# Altium footprint library TranDangKhoa-LIB.PcbLib: 1435 footprints (part 75 of 90)
Each footprint in its own frame and in the unit in brackets; x right, y up, seen from the top. Pads: shape width x height; smd on the part's side, far side on the other; paste and mask are expansions set on the pad; w line width, h text height; cw(c..) or ccw(c..) is an arc to the next point about the centre after c.
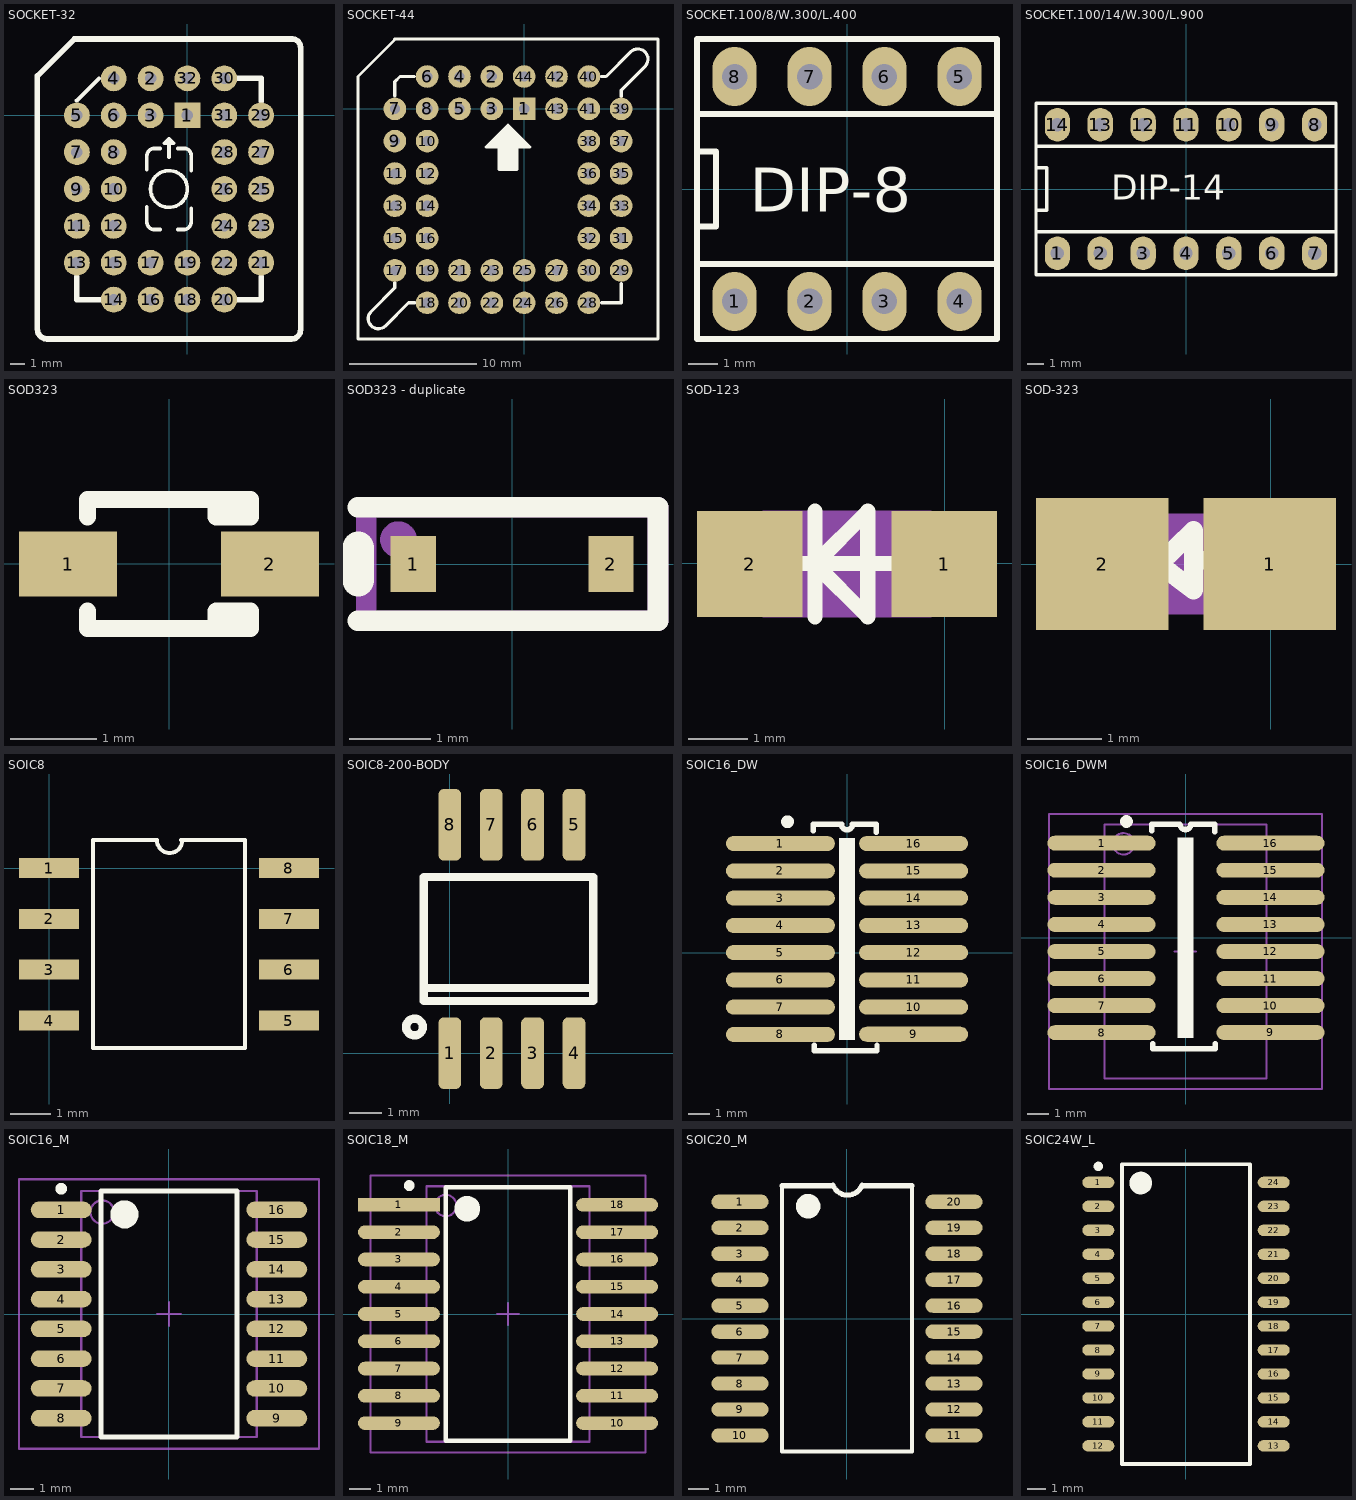
[diagram p74: the footprints below, top view; thin cyan lines are the x and y axes]

## SOCKET-32 [mil]
pads (32):
  rect 70x70 hole 31.5 unplated: 1(0,0)
  round 70 hole 31.5 unplated: 2(-100,100) 3(-100,0) 4(-200,100) 5(-300,0) 6(-200,0) 7(-300,-100) 8(-200,-100) 9(-300,-200) 10(-200,-200) 11(-300,-300) 12(-200,-300) 13(-300,-400) 14(-200,-500) 15(-200,-400) 16(-100,-500) 17(-100,-400) 18(0,-500) 19(0,-400) 20(100,-500) 21(200,-400) 22(100,-400) 23(200,-300) 24(100,-300) 25(200,-200) 26(100,-200) 27(200,-100) 28(100,-100) 29(200,0) 30(100,100) 31(100,0) 32(0,100)
Top Overlay:
  lines w10: -300,-438 -300,-500 -238,-500 ; -110,-248 -110,-290 ccw(c-90,-290) -90,-310 -74,-310 ; -110,-148 -110,-110 cw(c-90,-110) -90,-90 -74,-90 ; -50,-114 -50,-64 ; -26,-310 -10,-310 ccw(c-10,-290) 10,-290 10,-252 ; -26,-90 -8,-90 cw(c-8,-108) 10,-108 10,-150 ; -0.27,-194.77 ccw(c-50,-200) -0.06,-197.62 ; 138,-500 200,-500 200,-438 ; 138,100 200,100 200,38 ; -50,-64 -38,-76 -62,-76 -50,-64
  lines w11.81: -300,40 -240,100
  lines w15: -300,-438 -300,-500 -238,-500 ; 138,-500 200,-500 200,-438 ; 138,100 200,100 200,38 ; -407,-580 ccw(c-380,-580) -380,-607 282,-607 ccw(c282,-582) 307,-582 307,184 ccw(c284,184) 284,207 -307,207 -407,107 -407,-580

## SOCKET-44 [mil]
pads (44):
  rect 70x70 hole 31.5 unplated: 1(0,0)
  round 70 hole 31.5 unplated: 2(-100,100) 3(-100,0) 4(-200,100) 5(-200,0) 6(-300,100) 7(-400,0) 8(-300,0) 9(-400,-100) 10(-300,-100) 11(-400,-200) 12(-300,-200) 13(-400,-300) 14(-300,-300) 15(-400,-400) 16(-300,-400) 17(-400,-500) 18(-300,-600) 19(-300,-500) 20(-200,-600) 21(-200,-500) 22(-100,-600) 23(-100,-500) 24(0,-600) 25(0,-500) 26(100,-600) 27(100,-500) 28(200,-600) 29(300,-500) 30(200,-500) 31(300,-400) 32(200,-400) 33(300,-300) 34(200,-300) 35(300,-200) 36(200,-200) 37(300,-100) 38(200,-100) 39(300,0) 40(200,100) 41(200,0) 42(100,100) 43(100,0) 44(0,100)
Top Overlay:
  lines w10: -400,-538 -400,-553.68 -473.31,-626.99 ccw(c-450.93,-648.93) -430.3,-672.52 -357.77,-600 -338,-600 ; -400,40 -400,84 -384,100 -340,100 ; -400,216 414,216 414,-712 -514,-712 -514,100 ; -106,-108 -66,-108 ; -98,-100 -66,-100 ; -86.55,-100 -86.55,-90 -66,-90 ; -82.22,-86 -66,-86 ; -72,-188 -22,-188 -22,-118 ; -70,-188 -78,-188 -78,-118 ; -34,-110 6,-110 ; -34,-102 -4,-102 ; -34,-92 -12,-92 ; -34,-86 -22,-86 ; 238,100 253.45,100 330.98,177.53 cw(c351.62,153.94) 374,132 300,58 300,38 ; 240,-600 300,-600 300,-540 ; -514,100 -398,216 -514,100 ; -78,-118 -22,-118 ; -78,-118 -118,-118 -50,-50 18,-118 -22,-118
  lines w20: -66,-178 -66,-76 -34,-76 ; -50,-59.21 -50,-118 -50,-178 -34,-178 -34,-78

## SOCKET.100/8/W.300/L.400 [mm]
pads (8):
  oval 1.5x2 hole 0.864: 1(-3.81,-3.81) 2(-1.27,-3.81) 3(1.27,-3.81) 4(3.81,-3.81) 5(3.81,3.81) 6(1.27,3.81) 7(-1.27,3.81) 8(-3.81,3.81)
Top Overlay:
  lines w0.203: -5.08,-2.54 5.08,-2.54 ; -5.08,-2.54 -5.08,2.54 ; -5.08,-2.54 5.08,-2.54 ; -5.08,-2.54 -5.08,2.54 ; -5.08,-2.54 -5.08,-5.08 5.08,-5.08 5.08,2.54 ; -5.08,-2.54 -5.08,-1.27 ; -5.08,-1.27 -4.445,-1.27 ; -5.08,-1.27 -4.445,-1.27 ; -5.08,-1.27 -5.08,1.27 ; -5.08,1.27 -4.445,1.27 ; -5.08,1.27 -4.445,1.27 ; -5.08,1.27 -5.08,5.08 5.08,5.08 5.08,2.54 ; -5.08,2.54 5.08,2.54 ; -5.08,2.54 5.08,2.54 ; -4.445,-1.27 -4.445,1.27 ; -4.445,-1.27 -4.445,1.27 ; 5.08,-2.54 5.08,2.54 ; 5.08,-2.54 5.08,2.54
  text "DIP-8" at -3.302,-0.762 h1.5
3D body "Socket 8.step": height 4.5, standoff -3.09, extent -5.08,-5.08 5.08,5.08

## SOCKET.100/14/W.300/L.900 [mm]
height 5.59
pads (14):
  oval 1.5x2 hole 0.8: 1(-7.62,-3.81) 2(-5.08,-3.81) 3(-2.54,-3.81) 4(0,-3.81) 5(2.54,-3.81) 6(5.08,-3.81) 7(7.62,-3.81) 8(7.62,3.81) 9(5.08,3.81) 10(2.54,3.81) 11(0,3.81) 12(-2.54,3.81) 13(-5.08,3.81) 14(-7.62,3.81)
Top Overlay:
  lines w0.203: -8.89,-2.54 -8.89,-1.27 ; -8.89,-2.54 -8.89,-1.27 ; -8.89,-2.54 8.89,-2.54 ; -8.89,-2.54 8.89,-2.54 ; -8.89,-1.27 -8.255,-1.27 ; -8.89,-1.27 -8.89,1.27 ; -8.89,-1.27 -8.255,-1.27 ; -8.89,-1.27 -8.89,1.27 ; -8.89,1.27 -8.255,1.27 ; -8.89,1.27 -8.89,2.54 ; -8.89,1.27 -8.255,1.27 ; -8.89,1.27 -8.89,2.54 ; -8.89,2.54 8.89,2.54 ; -8.89,2.54 8.89,2.54 ; -8.255,-1.27 -8.255,1.27 ; -8.255,-1.27 -8.255,1.27 ; 8.89,-2.54 8.89,2.54 ; -8.89,-5.08 8.89,-5.08 8.89,5.08 -8.89,5.08 -8.89,-5.08
  text "DIP-14" at -4.445,-0.635 h1.5
3D body "Socket 14.step": height 4.5, standoff -3.09, extent -8.89,-5.08 8.89,5.08

## SOD323 [mil]
pads (2):
  rect 45x30 smd: 1(-46.26,0) 2(46.26,0)
Top Overlay:
  lines w7.87: -37.4,-21.65 -37.4,-29.53 37.4,-29.53 37.4,-21.65 21.65,-21.65 21.65,-29.53 ; -37.4,21.65 -37.4,29.53 37.4,29.53 37.4,21.65 21.65,21.65 21.65,29.53
3D body: height 20, standoff 0, extent -39.02,-27.04 21.04,28.02
3D body: height 20, standoff 0, extent 20.98,-27.04 38.04,28.02

## SOD323 - duplicate [mil]
pads (2):
  rect 22x27 smd mask+3: 1(-48,0) 2(48,0)
Top Overlay:
  lines w10: -74.8,-27.56 70.87,-27.56 70.87,27.56 -74.8,27.56
  lines w15.75: -74.8,-7.87 -74.8,7.87
Mechanical 16:
  circle w10: c-55.12,11.81 r3.94
  lines w10: -70.87,-27.56 -70.87,27.56 70.87,27.56 70.87,-27.56 -70.87,-27.56
Mechanical 29:
  text ".Designator" at -7.87,-7.87 h15.75
3D body "SOD323.step": height 38.78, standoff -0.2, extent -49.21,-24.6 49.21,24.61

## SOD-123 [mil]
pads (2):
  rect 70x70 smd: 1(-0.46,-0.41) 2(-129.46,-0.41)
Top Overlay:
  lines w10: -157.48,-19.68 -157.48,19.68 ; -102.36,0 -31.5,0 ; -86.18,-35.41 -86.18,34.59 ; -86.18,-0.41 -51.18,34.59 -51.18,-35.41 -86.18,-0.41
Mechanical 2:
  rectangle: -120.96,-35.91 -8.96,35.09
  rectangle: -140.96,-14.41 11.04,13.59

## SOD-323 [mil]
pads (2):
  rect 70x70 smd: 1(-0.47,0.05) 2(-89.05,0.05)
Top Overlay:
  lines w10: -59.52,-22.58 -59.52,23.68 ; -40.82,2.02 -18.18,2.02 ; -59.05,0.05 -40.82,17.77 -40.82,-13.73 -59.05,0.05
Mechanical 2:
  rectangle: -80.19,-26.52 -9.32,26.63
  rectangle: -97.91,-7.82 8.39,7.93

## SOIC8 [mm]
height 1
pads (8):
  rect 1.5x0.5 smd: 1(0,0) 2(0,-1.27) 3(0,-2.54) 4(0,-3.81) 5(6,-3.81) 6(6,-2.54) 7(6,-1.27) 8(6,0)
Top Overlay:
  lines w0.1: 3.3,0.7 4.9,0.7 4.9,-4.5 1.1,-4.5 1.1,0.7 2.7,0.7 ccw(c3.017,0.7) 3.335,0.7

## SOIC8-200-BODY [mm]
pads (8):
  rrect50% 0.7x2.2 smd: 1(0,0) 2(1.27,0) 3(2.54,0) 4(3.81,0) 5(3.81,7) 6(2.54,7) 7(1.27,7) 8(0,7)
Top Overlay:
  circle w0.254: c-1.082,0.8 r0.257
  lines w0.254: -0.8,2 4.4,2 ; -0.8,1.6 -0.8,5.4 4.4,5.4 4.4,1.6 -0.8,1.6
3D body "SOIC8-200body.stp": height 1.06, standoff -0.1, extent -0.7,0.115 4.707,6.885

## SOIC16_DW [mm] "SOIC, 16-Leads, Body 10x3.8mm, Pitch 1.27mm"
height 2.65
pads (16):
  oval 5.08x0.7 smd: 1(-3.1,5.08) 2(-3.1,3.81) 3(-3.1,2.54) 4(-3.1,1.27) 5(-3.1,0) 6(-3.1,-1.27) 7(-3.1,-2.54) 8(-3.1,-3.81) 9(3.1,-3.8) 10(3.1,-2.54) 11(3.1,-1.27) 12(3.1,0) 13(3.1,1.27) 14(3.1,2.54) 15(3.1,3.81) 16(3.1,5.08)
Top Overlay:
  circle w0.4: c-2.767,6.096 r0.1
  rectangle: -0.381,-4.064 0.381,5.334
  lines w0.254: -1.575,5.664 -1.575,5.969 -0.254,5.969 ccw(c0,5.969) 0.254,5.969 1.372,5.969 1.372,5.613 ; -1.524,-4.318 -1.524,-4.572 1.397,-4.572 1.397,-4.318

## SOIC16_DWM [mm] "SOIC, 16-Leads, Body 10x3.8mm, Pitch 0.3inc"
height 2.65
pads (16):
  oval 5.08x0.7 smd: 1(-3.963,4.445) 2(-3.963,3.175) 3(-3.963,1.905) 4(-3.963,0.635) 5(-3.963,-0.635) 6(-3.963,-1.905) 7(-3.963,-3.175) 8(-3.963,-4.445) 9(3.963,-4.435) 10(3.963,-3.175) 11(3.963,-1.905) 12(3.963,-0.635) 13(3.963,0.635) 14(3.963,1.905) 15(3.963,3.175) 16(3.963,4.445)
Top Overlay:
  circle w0.4: c-2.793,5.461 r0.1
  rectangle: -0.407,-4.699 0.355,4.699
  lines w0.254: -1.601,5.029 -1.601,5.334 -0.28,5.334 ccw(c-0.026,5.334) 0.228,5.334 1.346,5.334 1.346,4.978 ; -1.55,-4.953 -1.55,-5.207 1.371,-5.207 1.371,-4.953
Mechanical 13:
  circle w0.1: c-2.926,4.415 r0.5
  lines w0.1: -3.826,-6.585 -3.826,5.315 3.774,5.315 3.774,-6.585 -3.826,-6.585
Mechanical 15:
  lines w0.1: -0.526,-0.635 0.474,-0.635 ; -0.026,-1.135 -0.026,-0.135 ; -6.426,-7.085 -6.426,5.815 6.374,5.815 6.374,-7.085 -6.426,-7.085
3D body: height 2.65, standoff 0, extent -3.826,-6.585 3.774,5.315

## SOIC16_M [mm] "16-Pin Small Outline Integrated Circuit Package (SOIC16), IPC Low Density"
height 2.65
pads (16):
  oval 2.6x0.7 smd: 1(-4.6,4.445) 2(-4.6,3.175) 3(-4.6,1.905) 4(-4.6,0.635) 5(-4.6,-0.635) 6(-4.6,-1.905) 7(-4.6,-3.175) 8(-4.6,-4.445) 9(4.6,-4.445) 10(4.6,-3.175) 11(4.6,-1.905) 12(4.6,-0.635) 13(4.6,0.635) 14(4.6,1.905) 15(4.6,3.175) 16(4.6,4.445)
Top Overlay:
  circle w0.6: c-1.9,4.25 r0.3
  circle w0.25: c-4.6,5.345 r0.125
  lines w0.2: -2.9,-5.25 2.9,-5.25 2.9,5.25 -2.9,5.25 -2.9,-5.25
Mechanical 13:
  circle w0.1: c-2.85,4.35 r0.5
  lines w0.1: -3.75,-5.25 3.75,-5.25 3.75,5.25 -3.75,5.25 -3.75,-5.25
Mechanical 15:
  lines w0.1: -0.5,0 0.5,0 ; 0,-0.5 0,0.5 ; -6.4,-5.75 6.4,-5.75 6.4,5.75 -6.4,5.75 -6.4,-5.75
3D body: height 2.65, standoff 0, extent -3.75,-5.25 3.75,5.25

## SOIC18_M [mm] "SOIC, 18-Leads, Body 11.6x7.5mm, Pitch 1.27mm, IPC Low Density"
height 2.65
pads (18):
  rect 3.81x0.635 smd: 1(-5.08,5.08)
  oval 3.81x0.635 smd: 2(-5.08,3.81) 3(-5.08,2.54) 4(-5.08,1.27) 5(-5.08,0) 6(-5.08,-1.27) 7(-5.08,-2.54) 8(-5.08,-3.81) 9(-5.08,-5.08) 10(5.08,-5.08) 11(5.08,-3.81) 12(5.08,-2.54) 13(5.08,-1.27) 14(5.08,0) 15(5.08,1.27) 16(5.08,2.54) 17(5.08,3.81) 18(5.08,5.08)
Top Overlay:
  circle w0.25: c-4.6,5.98 r0.125
  circle w0.6: c-1.9,4.9 r0.3
  lines w0.2: -2.9,-5.9 -2.9,5.9 2.9,5.9 2.9,-5.9 -2.9,-5.9
Mechanical 13:
  circle w0.1: c-2.9,5.05 r0.5
  lines w0.1: -3.8,-5.95 -3.8,5.95 3.8,5.95 3.8,-5.95 -3.8,-5.95
Mechanical 15:
  lines w0.1: -0.5,0 0.5,0 ; 0,-0.5 0,0.5 ; -6.4,-6.45 -6.4,6.45 6.4,6.45 6.4,-6.45 -6.4,-6.45

## SOIC20_M [mm] "20-Pin Small Outline Integrated Circuit 1.27 mm Pitch, IPC Low Density"
height 2.65
pads (20):
  oval 2.794x0.7 smd: 1(-5.235,5.715) 2(-5.235,4.445) 3(-5.235,3.175) 4(-5.235,1.905) 5(-5.235,0.635) 6(-5.235,-0.635) 7(-5.235,-1.905) 8(-5.235,-3.175) 9(-5.235,-4.445) 10(-5.235,-5.715) 11(5.235,-5.715) 12(5.235,-4.445) 13(5.235,-3.175) 14(5.235,-1.905) 15(5.235,-0.635) 16(5.235,0.635) 17(5.235,1.905) 18(5.235,3.175) 19(5.235,4.445) 20(5.235,5.715)
Top Overlay:
  circle w0.6: c-1.9,5.5 r0.3
  lines w0.2: -3.175,6.5 -3.175,-6.5 3.175,-6.5 3.175,6.5
  lines w0.254: -3.175,6.5 -0.785,6.5 ; -0.692,6.535 ccw(c0.022,6.802) 0.73,6.522 ; 0.785,6.5 3.175,6.5

## SOIC24W_L [mm] "SOIC, 24-Leads, Body 15.4x7.5mm, Pitch 1.27mm, IPC High Density"
height 2.67
pads (24):
  oval 1.7x0.6 smd: 1(-4.65,6.985) 2(-4.65,5.715) 3(-4.65,4.445) 4(-4.65,3.175) 5(-4.65,1.905) 6(-4.65,0.635) 7(-4.65,-0.635) 8(-4.65,-1.905) 9(-4.65,-3.175) 10(-4.65,-4.445) 11(-4.65,-5.715) 12(-4.65,-6.985) 13(4.65,-6.985) 14(4.65,-5.715) 15(4.65,-4.445) 16(4.65,-3.175) 17(4.65,-1.905) 18(4.65,-0.635) 19(4.65,0.635) 20(4.65,1.905) 21(4.65,3.175) 22(4.65,4.445) 23(4.65,5.715) 24(4.65,6.985)
Top Overlay:
  circle w0.25: c-4.65,7.835 r0.125
  circle w0.6: c-2.4,6.95 r0.3
  lines w0.2: -3.4,-7.95 -3.4,7.95 3.4,7.95 3.4,-7.95 -3.4,-7.95